# Altium footprint library JL_PCB.PCBLIB: 1129 footprints (part 7 of 72)
Each footprint in its own frame and in the unit in brackets; x right, y up, seen from the top. Pads: shape width x height; smd on the part's side, far side on the other; paste and mask are expansions set on the pad; w line width, h text height; cw(c..) or ccw(c..) is an arc to the next point about the centre after c.
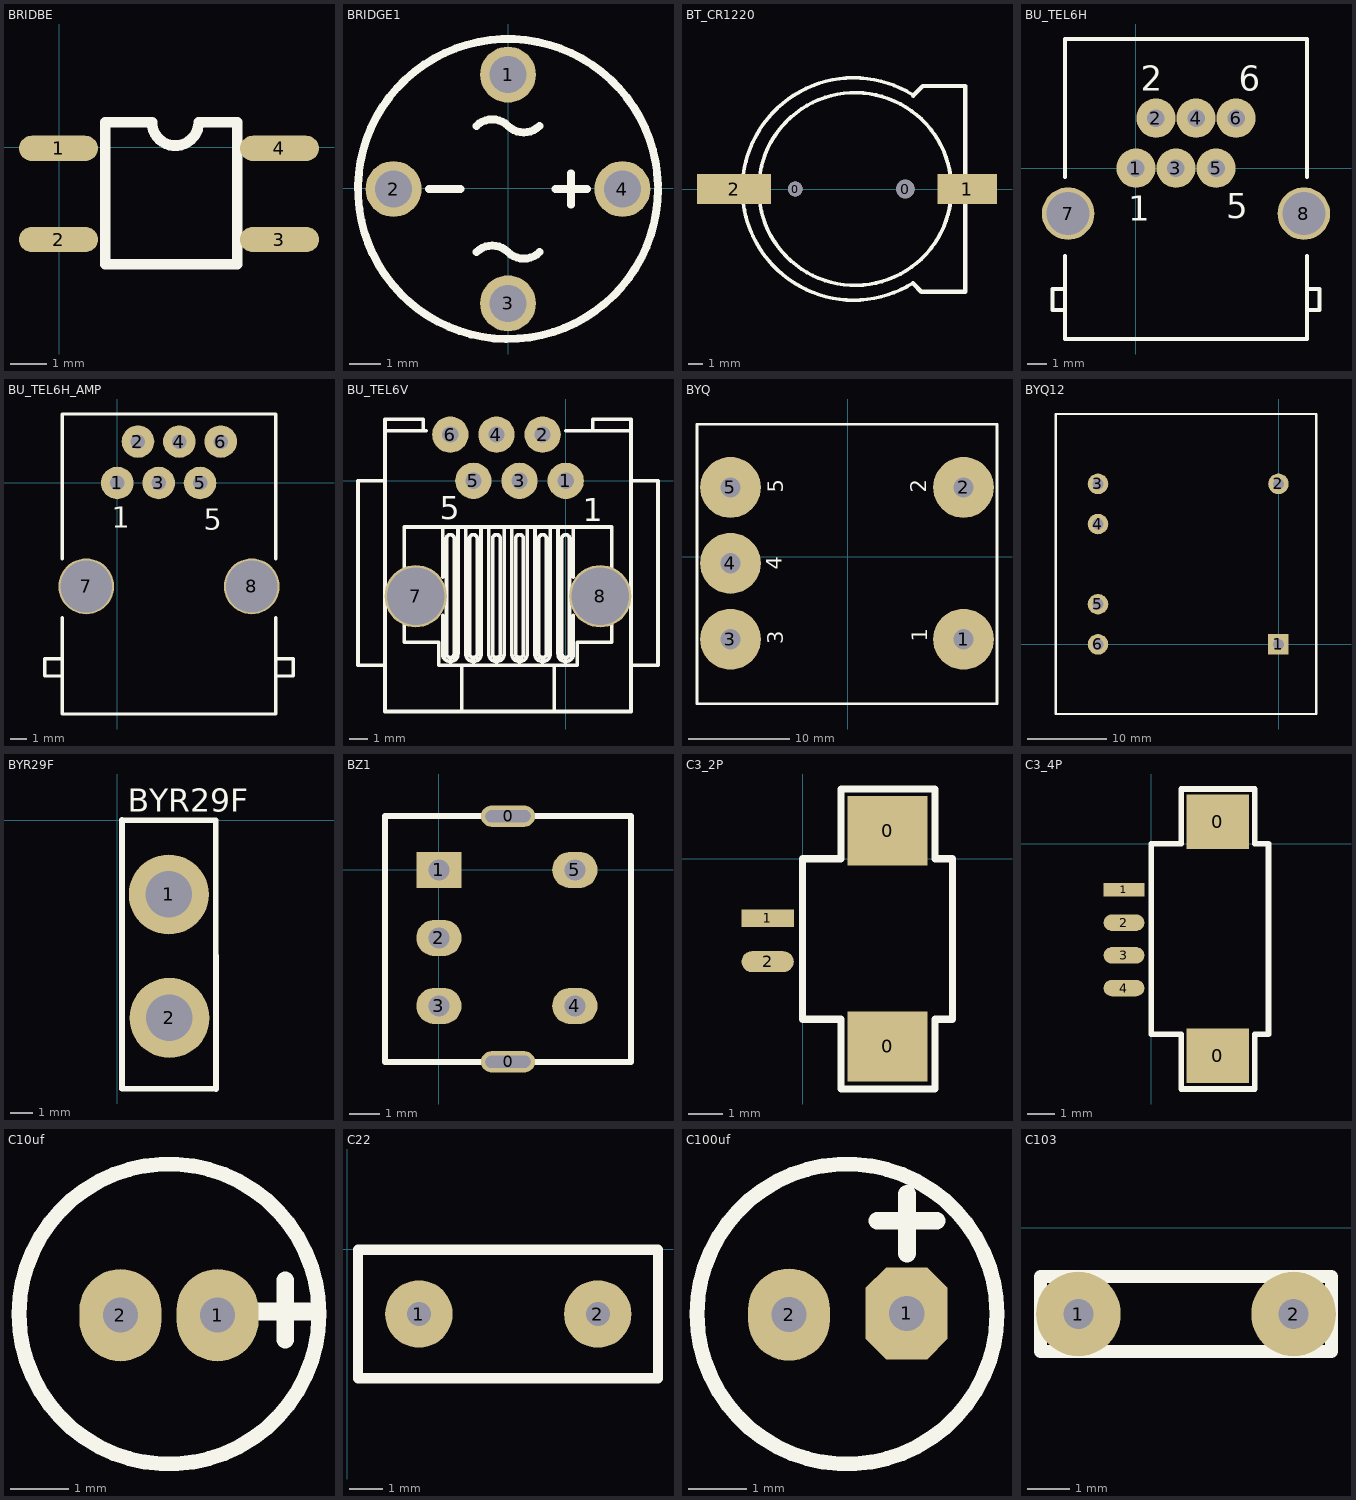
[diagram p6: the footprints below, top view; thin cyan lines are the x and y axes]

## BRIDBE [mm]
pads (4):
  oval 2.2x0.7 smd: 1(-0.025,-0.025) 2(-0.025,-2.565) 3(6.125,-2.565) 4(6.125,-0.025)
TopOverlay:
  lines w0.3: 1.275,-3.25 1.275,0.7 2.575,0.7 ccw(c3.225,0.7) 3.875,0.7 4.95,0.7 4.95,-3.25 1.275,-3.25

## BRIDGE1 [mm]
pads (4):
  round 1.8 hole 1.2: 1(0,3.658) 2(-3.683,-0.025) 3(0,-3.708) 4(3.683,-0.025)
TopOverlay:
  lines w0.254: -2.54,-0.025 -1.524,-0.025 ; -1.016,-2.057 cw(c-0.508,-2.565) 0,-2.057 ccw(c0.508,-1.549) 1.016,-2.057 ; -1.016,2.007 cw(c-0.508,1.499) 0,2.007 ccw(c0.508,2.515) 1.016,2.007 ; 1.524,-0.025 2.54,-0.025 ; 2.032,-0.533 2.032,0.483 ; 4.826,0.102 ccw(c0,-0.025) 4.828,-0.025

## BT_CR1220 [mil]
pads (4):
  round 40 hole 40: 0(342.52,0)
  round 50 hole 50: 0(640,0)
  rect 160x80 smd: 1(807.09,0)
  rect 200x80 smd: 2(177.16,0)
TopOverlay:
  circle w10: c503.94,0 r260.11
  lines w10: 659.93,254.01 ccw(c500,0) 660.14,-253.88
  lines w12: 660.45,251.97 686.52,278.04 801.66,278.04 801.66,0 801.66,-277.07 682.59,-277.07 661.42,-255.91
3D body "cr1220.STEP": height 158.08, standoff -36.4, extent 135.75,-295.69 864.09,294.74

## BU_TEL6H [mil]
pads (8):
  round 78.74 hole 35: 1(0,0) 2(40,100) 3(80,0) 4(120,100) 5(160,0) 6(200,100)
  round 105 hole 86: 7(-135.83,-90.83) 8(335.83,-90.83)
TopOverlay:
  lines w8: -141.67,-283.33 -166.67,-283.33 -166.67,-241.67 -141.67,-241.67 ; -141.67,-175.59 -141.67,-341.67 341.67,-341.67 341.67,-175.59 ; -141.67,-18.11 -141.67,258.33 341.67,258.33 341.67,-18.11 ; 341.67,-283.33 366.67,-283.33 366.67,-241.67 341.67,-241.67
  text "1" at -15,-105 h50
  text "5" at 180,-100 h50
  text "2" at 10,155 h50
  text "6" at 205,155 h50

## BU_TEL6H_AMP [mm]
pads (8):
  round 2 hole 0.889: 1(0,0) 2(1.27,2.54) 3(2.54,0) 4(3.81,2.54) 5(5.08,0) 6(6.35,2.54)
  round 3.429 hole 3.175: 7(-1.905,-6.35) 8(8.255,-6.35)
TopOverlay:
  lines w0.203: -3.387,-11.853 -4.445,-11.853 -4.445,-10.795 -3.387,-10.795 ; -3.387,-8.26 -3.387,-14.182 9.737,-14.182 9.737,-8.26 ; -3.387,-4.66 -3.387,4.233 9.737,4.233 9.737,-4.66 ; 9.737,-11.853 10.795,-11.853 10.795,-10.795 9.737,-10.795
  text "5" at 5.294,-2.862 h1.27
  text "1" at -0.347,-2.751 h1.27

## BU_TEL6V [mm]
pads (8):
  round 2 hole 0.889: 1(0,0) 2(-1.27,2.54) 3(-2.54,0) 4(-3.81,2.54) 5(-5.08,0) 6(-6.35,2.54)
  round 3.429 hole 3.175: 7(-8.255,-6.35) 8(1.905,-6.35)
TopOverlay:
  circle w0.203: c-8.255,-6.35 r1.482
  circle w0.203: c1.905,-6.35 r1.482
  lines w0.203: -9.948,-10.16 -11.43,-10.16 -11.43,0 -9.948,0 ; -8.89,-7.832 -8.89,-8.89 -6.985,-8.89 -6.985,-10.16 -5.715,-10.16 ; -8.89,-4.868 -8.89,-2.54 -6.985,-2.54 -6.773,-2.54 ; -7.832,2.752 -7.832,2.963 -7.832,3.387 -9.948,3.387 -9.948,2.752 ; -7.675,2.752 -9.948,2.752 ; -6.773,-7.408 -6.773,-9.525 ccw(c-6.35,-9.525) -5.927,-9.525 -5.927,-2.54 ; -6.773,-5.292 -6.773,-2.54 ; -5.715,-12.7 -5.715,-10.16 ; -5.503,-2.54 -5.503,-9.525 ccw(c-5.08,-9.525) -4.657,-9.525 -4.657,-2.54 ; -4.233,-2.54 -4.233,-9.525 ccw(c-3.81,-9.525) -3.387,-9.525 -3.387,-2.54 ; -2.963,-2.54 -2.963,-9.525 ccw(c-2.54,-9.525) -2.117,-9.525 -2.117,-2.54 ; -1.693,-2.54 -1.693,-9.525 ccw(c-1.27,-9.525) -0.847,-9.525 -0.847,-2.54 ; -0.635,-12.7 -0.635,-10.16 ; -0.423,-2.54 -0.423,-9.525 ccw(c0,-9.525) 0.423,-9.525 0.423,-7.408 ; 0,2.752 3.598,2.752 ; 0.423,-5.292 0.423,-2.54 ; 1.482,2.752 1.482,3.387 3.598,3.387 3.598,2.752 ; 2.54,-7.832 2.54,-8.89 0.635,-8.89 0.635,-10.16 -0.635,-10.16 ; 2.54,-4.868 2.54,-2.54 0.635,-2.54 -6.773,-2.54 ; 3.598,-10.16 5.08,-10.16 5.08,0 3.598,0 ; -9.948,2.752 -9.948,-12.7 3.598,-12.7 3.598,2.752 ; -5.715,-10.16 -0.635,-10.16 ; -6.562,-9.525 ccw(c-6.35,-9.525) -6.138,-9.525 -6.138,-3.175 ccw(c-6.35,-3.175) -6.562,-3.175 -6.562,-9.525 ; -5.292,-9.525 ccw(c-5.08,-9.525) -4.868,-9.525 -4.868,-3.175 ccw(c-5.08,-3.175) -5.292,-3.175 -5.292,-9.525 ; -4.022,-9.525 ccw(c-3.81,-9.525) -3.598,-9.525 -3.598,-3.175 ccw(c-3.81,-3.175) -4.022,-3.175 -4.022,-9.525 ; -2.752,-9.525 ccw(c-2.54,-9.525) -2.328,-9.525 -2.328,-3.175 ccw(c-2.54,-3.175) -2.752,-3.175 -2.752,-9.525 ; -1.482,-9.525 ccw(c-1.27,-9.525) -1.058,-9.525 -1.058,-3.175 ccw(c-1.27,-3.175) -1.482,-3.175 -1.482,-9.525 ; -0.212,-9.525 ccw(c0,-9.525) 0.212,-9.525 0.212,-3.175 ccw(c0,-3.175) -0.212,-3.175 -0.212,-9.525
  text "1" at 0.95,-2.218 h1.27
  text "5" at -6.921,-2.121 h1.27

## BYQ [mm]
pads (5):
  round 6 hole 2: 1(11.43,-8.128) 2(11.43,6.858) 3(-11.557,-8.128) 4(-11.557,-0.635) 5(-11.557,6.858)
TopOverlay:
  lines w0.254: -14.859,-14.478 14.732,-14.478 14.732,13.081 -14.859,13.081 -14.859,-14.478
  text "3" at -6.35,-8.636 h1.52
  text "4" at -6.477,-1.27 h1.52
  text "5" at -6.35,6.35 h1.52
  text "2" at 7.747,6.35 h1.52
  text "1" at 7.874,-8.382 h1.52

## BYQ12 [mm]
pads (6):
  rect 2.6x2.6 hole 1.4: 1(-0.025,-0.025)
  round 2.6 hole 1.4: 2(-0.025,20.295) 3(-22.885,20.295) 4(-22.885,15.215) 5(-22.885,5.055) 6(-22.885,-0.025)
TopOverlay:
  lines w0.3: -28.225,-8.85 -28.225,29.15 4.75,29.15 4.75,-8.85 -28.225,-8.85

## BYR29F [mil]
pads (2):
  round 137.79 hole 80: 1(88.82,-127.48) 2(90,-340)
TopOverlay:
  lines w10: 8.27,-462.12 170.1,-462.4 169.8,0.4 8.27,0.47 8.27,-462.12
  text "BYR29F" at 18.4,14.7 h39.37

## BZ1 [mm]
pads (7):
  oval 1.8x0.7 hole 0.4 slot 1.5 at 0.4 deg: 0(2.286,-6.35) 0(2.286,1.778)
  rect 1.5x1.2 hole 0.7: 1(0,0)
  oval 1.5x1.2 hole 0.7: 2(0,-2.25) 3(0,-4.5) 4(4.5,-4.5) 5(4.5,0)
TopOverlay:
  lines w0.2: -1.778,-6.35 -1.778,1.778 6.35,1.778 6.35,-6.35 -1.778,-6.35
3D body: height 9.5, standoff 0.2, extent -1.777,-6.349 6.349,1.777

## C3_2P [mm]
height 3.4
pads (4):
  rect 2.3x2 smd: 0(2.438,-5.379) 0(2.438,0.806)
  rect 1.5x0.5 smd: 1(-1,-1.7)
  oval 1.5x0.6 smd: 2(-1,-2.95)
TopOverlay:
  lines w0.203: 1.1,-0.007 1.1,2 3.8,2 3.8,0 4.3,0 4.3,-4.6 3.8,-4.6 ; 1.1,0 0,0 0,-4.6 1.1,-4.6 1.1,-6.6 3.8,-6.6 ; 3.8,-6.589 3.8,-4.589
3D body "01111.stp": height 3.46, standoff 0.01, extent -0.286,-6.111 4.064,1.489

## C3_4P [mm]
height 3.4
pads (6):
  rect 2.3x2 smd: 0(2.438,-7.779) 0(2.438,0.806)
  rect 1.5x0.5 smd: 1(-1,-1.7)
  oval 1.5x0.6 smd: 2(-1,-2.9) 3(-1,-4.1) 4(-1,-5.3)
TopOverlay:
  lines w0.203: 1.1,-7 0,-7 0,0 1.1,0 ; 1.1,-6.992 1.1,-9 3.8,-9 3.8,-7 4.3,-7 4.3,0 3.8,0 3.8,2 1.1,2 1.1,-0.007 ; 3.8,-7.002 3.802,-7
3D body "CS_4P.stp": height 3.45, standoff 0, extent -0.134,-8.454 4.216,1.546

## C10uf [mm]
pads (2):
  oval 1.4x1.575 hole 0.6: 1(7.76,-5.6) 2(6.1,-5.6)
TopOverlay:
  circle w0.254: c6.93,-5.58 r2.561
  lines w0.305: 8.433,-5.537 9.449,-5.537 ; 8.915,-6.02 8.915,-5.004
3D body "CAP PR2.0x5x11mm.STEP": height 11.53, standoff -3.27, extent 4.409,-8.077 9.46,-3.026

## C22 [mm]
pads (2):
  round 2 hole 0.711: 1(2.12,-1.925) 2(7.42,-1.925)
TopOverlay:
  lines w0.305: 0.315,-3.83 0.315,-0.02 9.205,-0.02 9.205,-3.83 0.315,-3.83
3D body "Cap 0_2in pitch.STEP": height 5.5, standoff -3.33, extent 2.101,-3.237 7.602,-0.737

## C100uf [mm]
pads (2):
  oct 1.4x1.575 hole 0.6: 1(5,-6.61)
  oval 1.4x1.575 hole 0.6: 2(2.99,-6.63)
TopOverlay:
  circle w0.254: c3.98,-6.62 r2.561
  lines w0.305: 4.496,-5.029 5.512,-5.029 ; 5.004,-5.588 5.004,-4.572

## C103 [mil]
pads (2):
  round 78.74 hole 28: 1(80,-80) 2(280,-80)
TopOverlay:
  lines w12: 45,-115 315,-115 315,-45 45,-45 45,-115